# Altium footprint library spider.PcbLib: 53 footprints (part 2 of 4)
Each footprint in its own frame and in the unit in brackets; x right, y up, seen from the top. Pads: shape width x height; smd on the part's side, far side on the other; paste and mask are expansions set on the pad; w line width, h text height; cw(c..) or ccw(c..) is an arc to the next point about the centre after c.
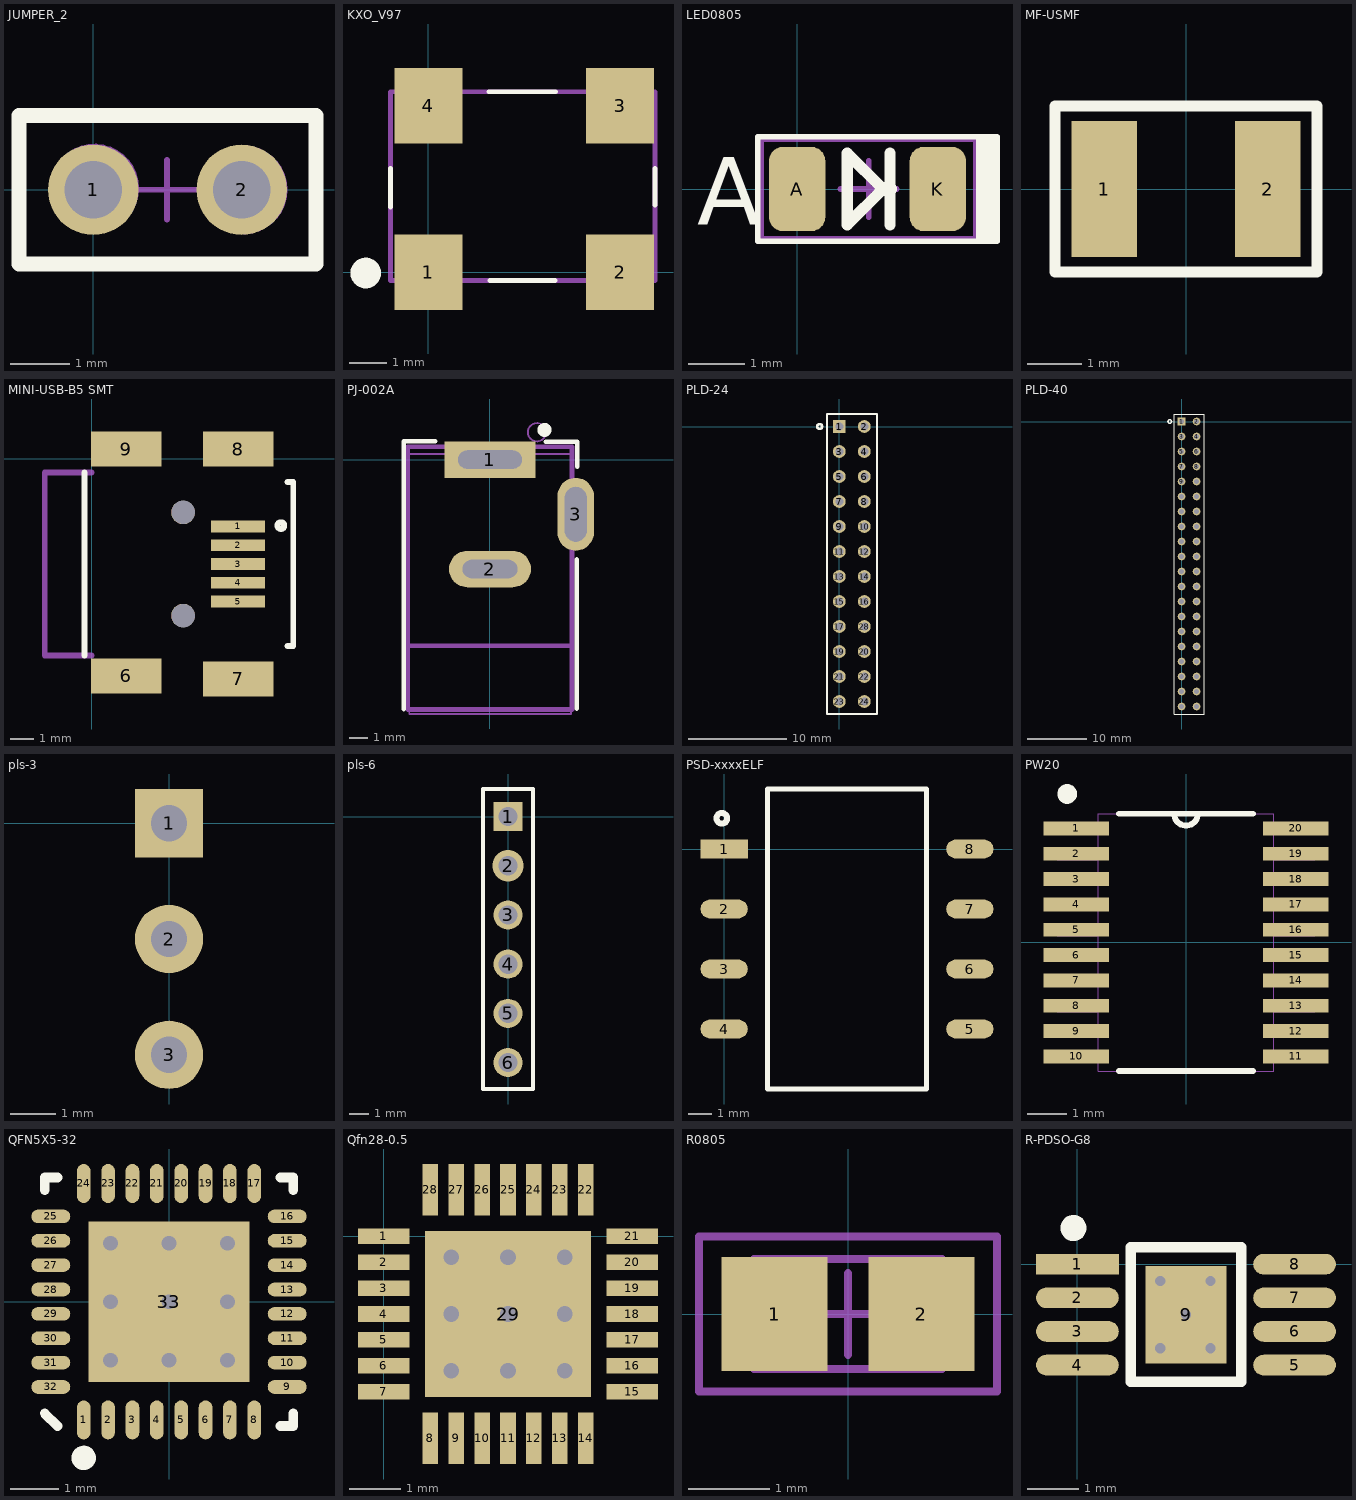
[diagram p1: the footprints below, top view; thin cyan lines are the x and y axes]

## JUMPER_2 [mil]
height 334.65
pads (2):
  round 60 hole 38: 1(0,0) 2(98.43,0)
Top Overlay:
  lines w9.84: -49.21,-49.21 147.64,-49.21 147.64,49.21 -49.21,49.21 -49.21,-49.21
Mechanical 13:
  circle w3.94: c99.21,0 r27.56
  circle w3.94: c0.79,0.98 r27.56
Mechanical 15:
  lines w3.94: 29.21,0 68.58,0 ; 48.9,-19.68 48.9,19.68 ; -49.21,-49.21 149.61,-49.21 149.61,50.2 -49.21,50.2 -49.21,-49.21
3D body: height 334.65, standoff -137.8, extent 71.65,-27.56 126.77,27.56
3D body: height 334.65, standoff -137.8, extent -26.77,-26.57 28.35,28.54
3D body: height 118.11, standoff 0, extent -50.2,-48.23 146.65,49.21

## KXO_V97 [mm]
height 1.3
pads (4):
  rect 1.8x2 smd: 1(0,0) 2(5.08,0) 3(5.08,4.4) 4(0,4.4)
Top Overlay:
  circle w0.4: c-1.656,-0.025 r0.206
  lines w0.127: -1,1.725 -1,2.75 ; 1.6,4.775 3.375,4.775 ; 1.625,-0.225 3.35,-0.225 ; 6,1.775 6,2.75
Mechanical 13:
  lines w0.127: -1,-0.225 6,-0.225 6,4.775 -1,4.775 -1,-0.225
3D body "User Library-KXO-97V.STEP": height 1.3, standoff 0, extent -0.96,-0.254 6.04,4.826

## LED0805 [mm]
height 1
pads (2):
  rrect50% 1x1.5 smd: A(0,0) K(2.5,0)
Top Overlay:
  lines w0.1: 3.225,-0.875 3.225,0.875 ; 3.275,-0.875 3.275,0.875 ; 3.375,-0.875 3.375,0.875 ; 3.45,-0.875 3.45,0.875 ; -0.7,-0.925 -0.7,0.925 3.55,0.925 3.55,-0.925 -0.7,-0.925
  lines w0.2: 1.651,-0.635 1.651,0.635 ; 0.889,-0.635 0.889,0.635 1.524,0 0.889,-0.635
  lines w0.254: 1.524,0 1.651,0
  text "A" at -1.778,-0.635 h1.2
Mechanical 13:
  lines w0.1: -0.635,-0.889 3.175,-0.889 3.175,0.889 -0.635,0.889 -0.635,-0.889
Mechanical 15:
  lines w0.1: 0.77,0 1.77,0 ; 1.27,-0.5 1.27,0.5 ; -0.635,-0.889 3.175,-0.889 3.175,0.889 -0.635,0.889 -0.635,-0.889
3D body "led_0805-red.STEP": height 1.1, standoff 0, extent 0.24,-0.625 2.26,0.625

## MF-USMF [mm]
pads (2):
  rect 1.2x2.5 smd: 1(-1.5,0) 2(1.5,0)
Top Overlay:
  lines w0.2: -2.4,-1.524 2.4,-1.524 2.4,1.524 -2.4,1.524 -2.4,-1.524
3D body "User Library-Fuse1210.STEP": height 0.67, standoff 0, extent -1.607,-1.287 1.608,1.288

## MINI-USB-B5 SMT [mm]
pads (11):
  rect 2.3x0.5 smd: 1(6.25,-2.9) 2(6.25,-3.7) 3(6.25,-4.5) 4(6.25,-5.3) 5(6.25,-6.1)
  rect 3x1.5 smd: 6(1.475,-9.275) 7(6.25,-9.4) 8(6.25,0.4) 9(1.475,0.4)
  round 1 hole 1 unplated: SYSPAD10(3.9,-6.7) SYSPAD11(3.9,-2.3)
Top Overlay:
  lines w0.25: -0.3,-8.4 -0.3,-0.6 ; 8.35,-8 8.6,-8 8.6,-1 8.35,-1
  lines w0.254: 8.174,-2.763 ccw(c8.074,-2.863) 8.2,-2.8
Mechanical 15:
  lines w0.25: 0,-8.4 -2,-8.4 -2,-0.6 0,-0.6
3D body "USB_mini_B.STEP": height 3.95, standoff -1, extent -1.836,-9.795 7.364,0.905

## PJ-002A [mm] "DC POWER JACK"
height 11
pads (3):
  rect 5x2 hole 1 slot 3.5 at 0 deg: 1(0,0)
  oval 4.5x2 hole 1 slot 3 at 0 deg: 2(0,-6)
  oval 2x4 hole 1.2 slot 3 at 90 deg: 3(4.7,-3)
Top Overlay:
  circle w0.4: c2.985,1.625 r0.185
  lines w0.254: -4.725,-13.675 -4.725,1 -3,1 ; 3.05,0.975 4.775,0.975 4.775,-0.4 ; 4.75,-13.645 4.75,-5.475
Mechanical 13:
  circle w0.1: c2.575,1.5 r0.5
  lines w0.1: -4.425,-13.95 4.45,-13.95 4.45,0.3 -4.425,0.3 -4.425,-13.95
Mechanical 15:
  lines w0.254: -4.5,-10.2 4.5,-10.2 ; -4.5,-13.7 -4.5,0.7 4.5,0.7 4.5,-13.7 -4.5,-13.7
3D body "DJK-02A.STEP": height 11, standoff -3.78, extent -4.373,-13.589 4.927,0.411

## PLD-24 [mm]
pads (24):
  rect 1.3x1.3 hole 0.8: 1(0,0)
  round 1.3 hole 0.8: 2(2.54,0) 3(0,-2.54) 4(2.54,-2.54) 5(0,-5.08) 6(2.54,-5.08) 7(0,-7.62) 8(2.54,-7.62) 9(0,-10.16) 10(2.54,-10.16) 11(0,-12.7) 12(2.54,-12.7) 13(0,-15.24) 14(2.54,-15.24) 15(0,-17.78) 16(2.54,-17.78) 17(0,-20.32) 19(0,-22.86) 20(2.54,-22.86) 21(0,-25.4) 22(2.54,-25.4) 23(0,-27.94) 24(2.54,-27.94) 28(2.54,-20.32)
Top Overlay:
  circle w0.254: c-2,0 r0.25
  lines w0.2: -1.27,-29.21 3.81,-29.21 3.81,1.27 -1.27,1.27 -1.27,-29.21
3D body: height 2.52, standoff 0, extent -1.27,-29.21 3.81,1.27
3D body: height 9, standoff -1, extent -0.298,-0.299 0.3,0.3
3D body: height 9, standoff -1, extent -0.099,-28.04 0.1,-27.84
3D body: height 9, standoff -1, extent -0.099,-2.64 0.1,-2.44
3D body: height 9, standoff -1, extent -0.099,-5.18 0.1,-4.98
3D body: height 9, standoff -1, extent -0.099,-7.72 0.1,-7.52
3D body: height 9, standoff -1, extent -0.099,-10.26 0.1,-10.06
3D body: height 9, standoff -1, extent -0.099,-12.8 0.1,-12.6
3D body: height 9, standoff -1, extent -0.099,-15.34 0.1,-15.14
3D body: height 9, standoff -1, extent -0.099,-17.88 0.1,-17.68
3D body: height 9, standoff -1, extent -0.099,-20.42 0.1,-20.22
3D body: height 9, standoff -1, extent -0.099,-22.96 0.1,-22.76
3D body: height 9, standoff -1, extent -0.298,-25.699 0.3,-25.1
3D body: height 9, standoff -1, extent 2.441,-25.5 2.64,-25.3
3D body: height 9, standoff -1, extent 2.441,-22.96 2.64,-22.76
3D body: height 9, standoff -1, extent 2.441,-20.42 2.64,-20.22
3D body: height 9, standoff -1, extent 2.441,-17.88 2.64,-17.68
3D body: height 9, standoff -1, extent 2.441,-15.34 2.64,-15.14
3D body: height 9, standoff -1, extent 2.441,-12.8 2.64,-12.6
3D body: height 9, standoff -1, extent 2.441,-10.26 2.64,-10.06
3D body: height 9, standoff -1, extent 2.441,-7.72 2.64,-7.52
3D body: height 9, standoff -1, extent 2.441,-5.18 2.64,-4.98
3D body: height 9, standoff -1, extent 2.441,-2.64 2.64,-2.44
3D body: height 9, standoff -1, extent 2.441,-28.04 2.64,-27.84
3D body: height 9, standoff -1, extent 2.242,-0.299 2.84,0.3

## PLD-40 [mm]
pads (40):
  rect 1.3x1.3 hole 0.8: 1(0,0)
  round 1.3 hole 0.8: 2(2.54,0) 3(0,-2.54) 4(2.54,-2.54) 5(0,-5.08) 6(2.54,-5.08) 7(0,-7.62) 8(2.54,-7.62) 9(0,-10.16) 10(2.54,-10.16) 11(0,-12.7) 12(2.54,-12.7) 13(0,-15.24) 14(2.54,-15.24) 15(0,-17.78) 16(2.54,-17.78) 17(0,-20.32) 18(2.54,-20.32) 19(0,-22.86) 20(2.54,-22.86) 21(0,-25.4) 22(2.54,-25.4) 23(0,-27.94) 24(2.54,-27.94) 25(0,-30.48) 26(2.54,-30.48) 27(0,-33.02) 28(2.54,-33.02) 29(0,-35.56) 30(2.54,-35.56) 31(0,-38.1) 32(2.54,-38.1) 33(0,-40.64) 34(2.54,-40.64) 35(0,-43.18) 36(2.54,-43.18) 37(0,-45.72) 38(2.54,-45.72) 39(0,-48.26) 40(2.54,-48.26)
Top Overlay:
  circle w0.254: c-2,0 r0.3
  lines w0.2: -1.27,-49.53 -1.27,1.27 3.81,1.27 3.81,-49.53 -1.27,-49.53
3D body: height 2, standoff 0, extent -1.27,-49.53 3.81,1.27
3D body: height 9, standoff -1, extent -0.298,-0.299 0.3,0.299
3D body: height 9, standoff -1, extent 2.242,-0.299 2.84,0.299
3D body: height 9, standoff -1, extent 2.242,-2.839 2.84,-2.241
3D body: height 9, standoff -1, extent -0.298,-2.839 0.3,-2.241
3D body: height 9, standoff -1, extent -0.298,-5.379 0.3,-4.781
3D body: height 9, standoff -1, extent 2.242,-5.379 2.84,-4.781
3D body: height 9, standoff -1, extent 2.242,-7.919 2.84,-7.321
3D body: height 9, standoff -1, extent -0.298,-7.919 0.3,-7.321
3D body: height 9, standoff -1, extent -0.298,-10.459 0.3,-9.861
3D body: height 9, standoff -1, extent 2.242,-10.459 2.84,-9.861
3D body: height 9, standoff -1, extent 2.242,-12.999 2.84,-12.401
3D body: height 9, standoff -1, extent -0.298,-12.999 0.3,-12.401
3D body: height 9, standoff -1, extent -0.298,-15.539 0.3,-14.941
3D body: height 9, standoff -1, extent 2.242,-15.539 2.84,-14.941
3D body: height 9, standoff -1, extent -0.298,-15.539 0.3,-14.941
3D body: height 9, standoff -1, extent 2.242,-15.539 2.84,-14.941
3D body: height 9, standoff -1, extent 2.242,-18.079 2.84,-17.481
3D body: height 9, standoff -1, extent 2.242,-23.159 2.84,-22.561
3D body: height 9, standoff -1, extent -0.298,-23.159 0.3,-22.561
3D body: height 9, standoff -1, extent -0.298,-20.619 0.3,-20.021
3D body: height 9, standoff -1, extent -0.298,-18.079 0.3,-17.481
3D body: height 9, standoff -1, extent -0.298,-20.619 0.3,-20.021
3D body: height 9, standoff -1, extent -0.298,-23.159 0.3,-22.561
3D body: height 9, standoff -1, extent -0.298,-25.699 0.3,-25.101
3D body: height 9, standoff -1, extent -0.298,-28.239 0.3,-27.641
3D body: height 9, standoff -1, extent -0.298,-30.779 0.3,-30.181
3D body: height 9, standoff -1, extent 2.242,-30.779 2.84,-30.181
3D body: height 9, standoff -1, extent 2.242,-28.239 2.84,-27.641
3D body: height 9, standoff -1, extent 2.242,-25.699 2.84,-25.101
3D body: height 9, standoff -1, extent 2.242,-20.619 2.84,-20.021
3D body: height 9, standoff -1, extent -0.298,-48.559 0.3,-47.961
3D body: height 9, standoff -1, extent 2.242,-48.559 2.84,-47.961
3D body: height 9, standoff -1, extent 2.242,-46.019 2.84,-45.421
3D body: height 9, standoff -1, extent -0.298,-46.019 0.3,-45.421
3D body: height 9, standoff -1, extent -0.298,-43.479 0.3,-42.881
3D body: height 9, standoff -1, extent 2.242,-43.479 2.84,-42.881
3D body: height 9, standoff -1, extent 2.242,-40.939 2.84,-40.341
3D body: height 9, standoff -1, extent -0.298,-40.939 0.3,-40.341
3D body: height 9, standoff -1, extent -0.298,-38.399 0.3,-37.801
3D body: height 9, standoff -1, extent 2.242,-38.399 2.84,-37.801
3D body: height 9, standoff -1, extent 2.242,-35.859 2.84,-35.261
3D body: height 9, standoff -1, extent -0.298,-35.859 0.3,-35.261
3D body: height 9, standoff -1, extent -0.298,-33.319 0.3,-32.721
3D body: height 9, standoff -1, extent 2.242,-33.319 2.84,-32.721
3D body: height 9, standoff -1, extent 2.242,-30.779 2.84,-30.181
3D body: height 9, standoff -1, extent -0.298,-30.779 0.3,-30.181

## pls-3 [mm]
pads (3):
  rect 1.5x1.5 hole 0.8: 1(0,0)
  round 1.5 hole 0.8: 2(0,-2.54) 3(0,-5.08)
3D body "User Library-PLS-3.STEP": height 8.54, standoff -3, extent -1.29,-6.31 1.25,1.31

## pls-6 [mm]
pads (6):
  rect 1.48x1.48 hole 0.98: 1(0,0)
  round 1.6 hole 0.98: 2(0,-2.5)
  round 1.48 hole 0.98: 3(0,-5) 4(0,-7.5) 5(0,-10) 6(0,-12.5)
Top Overlay:
  lines w0.2: -1.27,-13.843 -1.27,1.397 1.27,1.397 1.27,-13.843 -1.27,-13.843
3D body: height 8, standoff -3, extent -0.446,-12.949 0.45,-12.051
3D body: height 8, standoff -3, extent -0.446,-10.449 0.45,-9.551
3D body: height 8, standoff -3, extent -0.446,-7.949 0.45,-7.051
3D body: height 8, standoff -3, extent -0.446,-5.449 0.45,-4.551
3D body: height 8, standoff -3, extent -0.446,-2.949 0.45,-2.051
3D body: height 8, standoff -3, extent -0.446,-0.449 0.45,0.449
3D body: height 2, standoff 0, extent -1.15,-13.725 1.125,1.275

## PSD-xxxxELF [mm]
pads (8):
  rect 2x0.8 smd: 1(0,0)
  oval 2x0.8 smd: 2(0,-2.54) 3(0,-5.08) 4(0,-7.62) 5(10.4,-7.62) 6(10.4,-5.08) 7(10.4,-2.54) 8(10.4,0)
Top Overlay:
  circle w0.254: c-0.1,1.3 r0.224
  lines w0.2: 1.835,-10.16 1.835,2.54 8.565,2.54 8.565,-10.16 1.835,-10.16
3D body "User Library-psd-xxxxelf.STEP": height 6.25, standoff 0, extent -0.393,-10.16 10.807,2.54

## PW20 [mil]
pads (20):
  rect 66x14 smd: 1(-111,115.16) 2(-111,89.57) 3(-111,63.98) 4(-111,38.39) 5(-111,12.8) 6(-111,-12.8) 7(-111,-38.39) 8(-111,-63.98) 9(-111,-89.57) 10(-111,-115.16) 11(111,-115.16) 12(111,-89.57) 13(111,-63.98) 14(111,-38.39) 15(111,-12.8) 16(111,12.8) 17(111,38.39) 18(111,63.98) 19(111,89.57) 20(111,115.16)
Top Overlay:
  circle w10: c-120,150 r5
  lines w6: -67.51,-130 67.51,-130 ; -67.51,130 67.51,130 ; -12,130 ccw(c0,130) 12,130
Mechanical 1:
  lines w0: -12,130 ccw(c0,130) 12,130 ; -130,-121.16 -88.5,-121.16 -88.5,-109.16 -130,-109.16 -130,-121.16 ; -130,-95.57 -88.5,-95.57 -88.5,-83.57 -130,-83.57 -130,-95.57 ; -130,-69.98 -88.5,-69.98 -88.5,-57.98 -130,-57.98 -130,-69.98 ; -130,-44.39 -88.5,-44.39 -88.5,-32.39 -130,-32.39 -130,-44.39 ; -130,-18.8 -88.5,-18.8 -88.5,-6.8 -130,-6.8 -130,-18.8 ; -130,6.8 -88.5,6.8 -88.5,18.8 -130,18.8 -130,6.8 ; -130,32.39 -88.5,32.39 -88.5,44.39 -130,44.39 -130,32.39 ; -130,57.98 -88.5,57.98 -88.5,69.98 -130,69.98 -130,57.98 ; -130,83.57 -88.5,83.57 -88.5,95.57 -130,95.57 -130,83.57 ; -130,109.16 -88.5,109.16 -88.5,121.16 -130,121.16 -130,109.16 ; -88.5,-130 -88.5,130 88.5,130 88.5,-130 -88.5,-130 ; 88.5,-121.16 130,-121.16 130,-109.16 88.5,-109.16 88.5,-121.16 ; 88.5,-95.57 130,-95.57 130,-83.57 88.5,-83.57 88.5,-95.57 ; 88.5,-69.98 130,-69.98 130,-57.98 88.5,-57.98 88.5,-69.98 ; 88.5,-44.39 130,-44.39 130,-32.39 88.5,-32.39 88.5,-44.39 ; 88.5,-18.8 130,-18.8 130,-6.8 88.5,-6.8 88.5,-18.8 ; 88.5,6.8 130,6.8 130,18.8 88.5,18.8 88.5,6.8 ; 88.5,32.39 130,32.39 130,44.39 88.5,44.39 88.5,32.39 ; 88.5,57.98 130,57.98 130,69.98 88.5,69.98 88.5,57.98 ; 88.5,83.57 130,83.57 130,95.57 88.5,95.57 88.5,83.57 ; 88.5,109.16 130,109.16 130,121.16 88.5,121.16 88.5,109.16
3D body "mtc20.stp": height 38.48, standoff -0.89, extent -126.38,-127.94 126.39,127.96

## QFN5X5-32 [mm] "Quad Flat No Lead; 32 Terminals; Body 5 x 5 mm; Pitch 0.5 mm"
height 1
pads (33):
  oval 0.28x0.8 smd: 1(-1.75,-2.425) 2(-1.25,-2.425) 3(-0.75,-2.425) 4(-0.25,-2.425) 5(0.25,-2.425) 6(0.75,-2.425) 7(1.25,-2.425) 8(1.75,-2.425) 17(1.75,2.425) 18(1.25,2.425) 19(0.75,2.425) 20(0.25,2.425) 21(-0.25,2.425) 22(-0.75,2.425) 23(-1.25,2.425) 24(-1.75,2.425)
  oval 0.8x0.28 smd: 9(2.425,-1.75) 10(2.425,-1.25) 11(2.425,-0.75) 12(2.425,-0.25) 13(2.425,0.25) 14(2.425,0.75) 15(2.425,1.25) 16(2.425,1.75) 25(-2.425,1.75) 26(-2.425,1.25) 27(-2.425,0.75) 28(-2.425,0.25) 29(-2.425,-0.25) 30(-2.425,-0.75) 31(-2.425,-1.25) 32(-2.425,-1.75)
  rect 3.3x3.3 smd: 33(0,0)
via 0,0 diameter 0.8 hole 0.3
via -1.2,0 diameter 0.8 hole 0.3
via -1.2,-1.2 diameter 0.8 hole 0.3
via 0,-1.2 diameter 0.8 hole 0.3
via 1.2,-1.2 diameter 0.8 hole 0.3
via 1.2,0 diameter 0.8 hole 0.3
via 1.2,1.2 diameter 0.8 hole 0.3
via 0,1.2 diameter 0.8 hole 0.3
via -1.2,1.2 diameter 0.8 hole 0.3
Top Overlay:
  circle w0.25: c-1.75,-3.205 r0.125
  lines w0.2: -2.55,-2.29 -2.29,-2.55 ; -2.55,2.29 -2.55,2.55 -2.29,2.55 ; 2.29,-2.55 2.55,-2.55 2.55,-2.29 ; 2.29,2.55 2.55,2.55 2.55,2.29
3D body "User Library-qfn32-5x5with pad.STEP": height 0.8, standoff 0, extent -2.51,-2.51 2.51,2.51

## Qfn28-0.5 [mm]
pads (29):
  rect 1x0.3 smd: 1(0,0) 2(0,-0.5) 3(0,-1) 4(0,-1.5) 5(0,-2) 6(0,-2.5) 7(0,-3) 15(4.8,-3) 16(4.8,-2.5) 17(4.8,-2) 18(4.8,-1.5) 19(4.8,-1) 20(4.8,-0.5) 21(4.8,0)
  rect 0.3x1 smd: 8(0.9,-3.9) 9(1.4,-3.9) 10(1.9,-3.9) 11(2.4,-3.9) 12(2.9,-3.9) 13(3.4,-3.9) 14(3.9,-3.9) 22(3.9,0.9) 23(3.4,0.9) 24(2.9,0.9) 25(2.4,0.9) 26(1.9,0.9) 27(1.4,0.9) 28(0.9,0.9)
  rect 3.2x3.2 smd: 29(2.4,-1.5)
via 2.4,-2.6 diameter 0.8 hole 0.3
via 3.5,-2.6 diameter 0.8 hole 0.3
via 3.5,-1.5 diameter 0.8 hole 0.3
via 2.4,-1.5 diameter 0.8 hole 0.3
via 1.3,-2.6 diameter 0.8 hole 0.3
via 1.3,-1.5 diameter 0.8 hole 0.3
via 3.5,-0.4 diameter 0.8 hole 0.3
via 2.4,-0.4 diameter 0.8 hole 0.3
via 1.3,-0.4 diameter 0.8 hole 0.3
3D body "User Library-QFN28.STEP": height 0.9, standoff 0, extent -0.14,-4 4.9,1.04

## R0805 [mm] "Chip Capacitor, 2-Leads, Body 2,0x1,25mm, IPC Medium Density"
height 0.6
pads (2):
  rect 1.3x1.4 smd: 1(-0.9,0) 2(0.9,0)
Mechanical 2:
  lines w0.05: -1.85,0.925 -1.85,-0.925 1.825,-0.925 1.825,0.95 -1.85,0.95
  text ".designator" at -1.525,-0.225 h0.5
Mechanical 13:
  lines w0.1: -1.15,-0.675 -1.15,0.675 1.15,0.675 1.15,-0.675 -1.15,-0.675
Mechanical 15:
  lines w0.1: -0.5,0 0.5,0 ; 0,-0.5 0,0.5 ; -1.825,-0.95 -1.825,0.95 1.825,0.95 1.825,-0.95 -1.825,-0.95
3D body "User Library-RES_2013-0805.STEP": height 0.76, standoff 0, extent -1.15,-0.675 1.15,0.675

## R-PDSO-G8 [mm]
pads (9):
  rect 1.6x0.4 smd: 1(0,0)
  oval 1.6x0.4 smd: 2(0,-0.65) 3(0,-1.3) 4(0,-1.95) 5(4.2,-1.95) 6(4.2,-1.3) 7(4.2,-0.65) 8(4.2,0)
  rect 1.57x1.89 smd: 9(2.1,-0.975)
via 2.575,-1.625 diameter 0.4 hole 0.2
via 1.6,-1.625 diameter 0.4 hole 0.2
via 1.6,-0.325 diameter 0.4 hole 0.2
via 2.575,-0.325 diameter 0.4 hole 0.2
via 2.1,-0.975 diameter 0.4 hole 0.2
Top Overlay:
  circle w0.254: c-0.075,0.7 r0.125
  lines w0.2: 3.15,0.325 1.035,0.325 1.035,-2.275 3.165,-2.275 3.165,0.325
3D body: height 1.1, standoff 0.1, extent 0.45,-2.75 3.725,0.8